# Altium footprint library SAMTEC THD.PcbLib: 161 footprints (part 4 of 12) (continued)
## SAMTEC_MTLW-118-07-L-D-250 [mm] "36 Contacts - Pitch 2.54mm - Dual Row Through Mount Straight Header (Post Lead = 6.35mm, Tail Lead 3.05mm, Insulator 1.52mm)" (continued)
Mechanical 14:
  drawing of 255 lines, arcs and shapes, not listed
  text "1" at -23.837,-1.768 h1
3D body "SAMTEC_MTLW-118-07-L-D-250.stp": height 7.87, standoff -3.05, extent -22.86,-2.514 22.86,2.515

## SAMTEC_MTLW-120-07-L-D-250 [mm] "40 Contacts - Pitch 2.54mm - Dual Row Through Mount Straight Header (Post Lead = 6.35mm, Tail Lead 3.05mm, Insulator 1.52mm)"
height 7.87
pads (40):
  round 1.7 hole 1: 1(-24.13,-1.27) 2(-24.13,1.27) 3(-21.59,-1.27) 4(-21.59,1.27) 5(-19.05,-1.27) 6(-19.05,1.27) 7(-16.51,-1.27) 8(-16.51,1.27) 9(-13.97,-1.27) 10(-13.97,1.27) 11(-11.43,-1.27) 12(-11.43,1.27) 13(-8.89,-1.27) 14(-8.89,1.27) 15(-6.35,-1.27) 16(-6.35,1.27) 17(-3.81,-1.27) 18(-3.81,1.27) 19(-1.27,-1.27) 20(-1.27,1.27) 21(1.27,-1.27) 22(1.27,1.27) 23(3.81,-1.27) 24(3.81,1.27) 25(6.35,-1.27) 26(6.35,1.27) 27(8.89,-1.27) 28(8.89,1.27) 29(11.43,-1.27) 30(11.43,1.27) 31(13.97,-1.27) 32(13.97,1.27) 33(16.51,-1.27) 34(16.51,1.27) 35(19.05,-1.27) 36(19.05,1.27) 37(21.59,-1.27) 38(21.59,1.27) 39(24.13,-1.27) 40(24.13,1.27)
Top Overlay:
  circle w0.3: c-24.095,-3.135 r0.15
  lines w0.2: -25.4,-2.007 -25.4,2.007 -25.146,2.515 -23.114,2.515 -22.86,2.007 -22.606,2.515 -20.574,2.515 -20.32,2.007 -20.066,2.515 -18.034,2.515 -17.78,2.007 -17.526,2.515 -15.494,2.515 -15.24,2.007 -14.986,2.515 -12.954,2.515 -12.7,2.007 -12.446,2.515 -10.414,2.515 -10.16,2.007 -9.906,2.515 -7.874,2.515 -7.62,2.007 -7.366,2.515 -5.334,2.515 -5.08,2.007 -4.826,2.515 -2.794,2.515 -2.54,2.007 -2.286,2.515 -0.254,2.515 0,2.007 0.254,2.515 2.286,2.515 2.54,2.007 2.794,2.515 4.826,2.515 5.08,2.007 5.334,2.515 7.366,2.515 7.62,2.007 7.874,2.515 9.906,2.515 10.16,2.007 10.414,2.515 12.446,2.515 12.7,2.007 12.954,2.515 14.986,2.515 15.24,2.007 15.494,2.515 17.526,2.515 17.78,2.007 18.034,2.515 20.066,2.515 20.32,2.007 20.574,2.515 22.606,2.515 22.86,2.007 23.114,2.515 25.146,2.515 25.4,2.007 25.4,-2.007 25.146,-2.515 23.114,-2.515 22.86,-2.007 22.606,-2.515 20.574,-2.515 20.32,-2.007 20.066,-2.515 18.034,-2.515 17.78,-2.007 17.526,-2.515 15.494,-2.515 15.24,-2.007 14.986,-2.515 12.954,-2.515 12.7,-2.007 12.446,-2.515 10.414,-2.515 10.16,-2.007 9.906,-2.515 7.874,-2.515 7.62,-2.007 7.366,-2.515 5.334,-2.515 5.08,-2.007 4.826,-2.515 2.794,-2.515 2.54,-2.007 2.286,-2.515 0.254,-2.515 0,-2.007 -0.254,-2.515 -2.286,-2.515 -2.54,-2.007 -2.794,-2.515 -4.826,-2.515 -5.08,-2.007 -5.334,-2.515 -7.366,-2.515 -7.62,-2.007 -7.874,-2.515 -9.906,-2.515 -10.16,-2.007 -10.414,-2.515 -12.446,-2.515 -12.7,-2.007 -12.954,-2.515 -14.986,-2.515 -15.24,-2.007 -15.494,-2.515 -17.526,-2.515 -17.78,-2.007 -18.034,-2.515 -20.066,-2.515 -20.32,-2.007 -20.574,-2.515 -22.606,-2.515 -22.86,-2.007 -23.114,-2.515 -25.146,-2.515 -25.4,-2.007
  text "1" at -26.377,-1.768 h1
Mechanical 8:
  drawing of 164 lines, arcs and shapes, not listed
Mechanical 14:
  drawing of 283 lines, arcs and shapes, not listed
  text "1" at -26.377,-1.768 h1
3D body "SAMTEC_MTLW-120-07-L-D-250.stp": height 7.87, standoff -3.05, extent -25.4,-2.514 25.4,2.515

## SAMTEC_MTLW-121-07-L-D-250 [mm] "42 Contacts - Pitch 2.54mm - Dual Row Through Mount Straight Header (Post Lead = 6.35mm, Tail Lead 3.05mm, Insulator 1.52mm)"
height 7.87
pads (42):
  round 1.7 hole 1: 1(-25.4,-1.27) 2(-25.4,1.27) 3(-22.86,-1.27) 4(-22.86,1.27) 5(-20.32,-1.27) 6(-20.32,1.27) 7(-17.78,-1.27) 8(-17.78,1.27) 9(-15.24,-1.27) 10(-15.24,1.27) 11(-12.7,-1.27) 12(-12.7,1.27) 13(-10.16,-1.27) 14(-10.16,1.27) 15(-7.62,-1.27) 16(-7.62,1.27) 17(-5.08,-1.27) 18(-5.08,1.27) 19(-2.54,-1.27) 20(-2.54,1.27) 21(0,-1.27) 22(0,1.27) 23(2.54,-1.27) 24(2.54,1.27) 25(5.08,-1.27) 26(5.08,1.27) 27(7.62,-1.27) 28(7.62,1.27) 29(10.16,-1.27) 30(10.16,1.27) 31(12.7,-1.27) 32(12.7,1.27) 33(15.24,-1.27) 34(15.24,1.27) 35(17.78,-1.27) 36(17.78,1.27) 37(20.32,-1.27) 38(20.32,1.27) 39(22.86,-1.27) 40(22.86,1.27) 41(25.4,-1.27) 42(25.4,1.27)
Top Overlay:
  circle w0.3: c-25.365,-3.135 r0.15
  lines w0.2: -26.67,-2.007 -26.67,2.007 -26.416,2.515 -24.384,2.515 -24.13,2.007 -23.876,2.515 -21.844,2.515 -21.59,2.007 -21.336,2.515 -19.304,2.515 -19.05,2.007 -18.796,2.515 -16.764,2.515 -16.51,2.007 -16.256,2.515 -14.224,2.515 -13.97,2.007 -13.716,2.515 -11.684,2.515 -11.43,2.007 -11.176,2.515 -9.144,2.515 -8.89,2.007 -8.636,2.515 -6.604,2.515 -6.35,2.007 -6.096,2.515 -4.064,2.515 -3.81,2.007 -3.556,2.515 -1.524,2.515 -1.27,2.007 -1.016,2.515 1.016,2.515 1.27,2.007 1.524,2.515 3.556,2.515 3.81,2.007 4.064,2.515 6.096,2.515 6.35,2.007 6.604,2.515 8.636,2.515 8.89,2.007 9.144,2.515 11.176,2.515 11.43,2.007 11.684,2.515 13.716,2.515 13.97,2.007 14.224,2.515 16.256,2.515 16.51,2.007 16.764,2.515 18.796,2.515 19.05,2.007 19.304,2.515 21.336,2.515 21.59,2.007 21.844,2.515 23.876,2.515 24.13,2.007 24.384,2.515 26.416,2.515 26.67,2.007 26.67,-2.007 26.416,-2.515 24.384,-2.515 24.13,-2.007 23.876,-2.515 21.844,-2.515 21.59,-2.007 21.336,-2.515 19.304,-2.515 19.05,-2.007 18.796,-2.515 16.764,-2.515 16.51,-2.007 16.256,-2.515 14.224,-2.515 13.97,-2.007 13.716,-2.515 11.684,-2.515 11.43,-2.007 11.176,-2.515 9.144,-2.515 8.89,-2.007 8.636,-2.515 6.604,-2.515 6.35,-2.007 6.096,-2.515 4.064,-2.515 3.81,-2.007 3.556,-2.515 1.524,-2.515 1.27,-2.007 1.016,-2.515 -1.016,-2.515 -1.27,-2.007 -1.524,-2.515 -3.556,-2.515 -3.81,-2.007 -4.064,-2.515 -6.096,-2.515 -6.35,-2.007 -6.604,-2.515 -8.636,-2.515 -8.89,-2.007 -9.144,-2.515 -11.176,-2.515 -11.43,-2.007 -11.684,-2.515 -13.716,-2.515 -13.97,-2.007 -14.224,-2.515 -16.256,-2.515 -16.51,-2.007 -16.764,-2.515 -18.796,-2.515 -19.05,-2.007 -19.304,-2.515 -21.336,-2.515 -21.59,-2.007 -21.844,-2.515 -23.876,-2.515 -24.13,-2.007 -24.384,-2.515 -26.416,-2.515 -26.67,-2.007
  text "1" at -27.647,-1.768 h1
Mechanical 8:
  drawing of 172 lines, arcs and shapes, not listed
Mechanical 14:
  drawing of 297 lines, arcs and shapes, not listed
  text "1" at -27.647,-1.768 h1
3D body "SAMTEC_MTLW-121-07-L-D-250.stp": height 7.87, standoff -3.05, extent -26.67,-2.514 26.67,2.515

## SAMTEC_MTLW-122-07-L-D-250 [mm] "44 Contacts - Pitch 2.54mm - Dual Row Through Mount Straight Header (Post Lead = 6.35mm, Tail Lead 3.05mm, Insulator 1.52mm)"
height 7.87
pads (44):
  round 1.7 hole 1: 1(-26.67,-1.27) 2(-26.67,1.27) 3(-24.13,-1.27) 4(-24.13,1.27) 5(-21.59,-1.27) 6(-21.59,1.27) 7(-19.05,-1.27) 8(-19.05,1.27) 9(-16.51,-1.27) 10(-16.51,1.27) 11(-13.97,-1.27) 12(-13.97,1.27) 13(-11.43,-1.27) 14(-11.43,1.27) 15(-8.89,-1.27) 16(-8.89,1.27) 17(-6.35,-1.27) 18(-6.35,1.27) 19(-3.81,-1.27) 20(-3.81,1.27) 21(-1.27,-1.27) 22(-1.27,1.27) 23(1.27,-1.27) 24(1.27,1.27) 25(3.81,-1.27) 26(3.81,1.27) 27(6.35,-1.27) 28(6.35,1.27) 29(8.89,-1.27) 30(8.89,1.27) 31(11.43,-1.27) 32(11.43,1.27) 33(13.97,-1.27) 34(13.97,1.27) 35(16.51,-1.27) 36(16.51,1.27) 37(19.05,-1.27) 38(19.05,1.27) 39(21.59,-1.27) 40(21.59,1.27) 41(24.13,-1.27) 42(24.13,1.27) 43(26.67,-1.27) 44(26.67,1.27)
Top Overlay:
  circle w0.3: c-26.635,-3.135 r0.15
  lines w0.2: -27.94,-2.007 -27.94,2.007 -27.686,2.515 -25.654,2.515 -25.4,2.007 -25.146,2.515 -23.114,2.515 -22.86,2.007 -22.606,2.515 -20.574,2.515 -20.32,2.007 -20.066,2.515 -18.034,2.515 -17.78,2.007 -17.526,2.515 -15.494,2.515 -15.24,2.007 -14.986,2.515 -12.954,2.515 -12.7,2.007 -12.446,2.515 -10.414,2.515 -10.16,2.007 -9.906,2.515 -7.874,2.515 -7.62,2.007 -7.366,2.515 -5.334,2.515 -5.08,2.007 -4.826,2.515 -2.794,2.515 -2.54,2.007 -2.286,2.515 -0.254,2.515 0,2.007 0.254,2.515 2.286,2.515 2.54,2.007 2.794,2.515 4.826,2.515 5.08,2.007 5.334,2.515 7.366,2.515 7.62,2.007 7.874,2.515 9.906,2.515 10.16,2.007 10.414,2.515 12.446,2.515 12.7,2.007 12.954,2.515 14.986,2.515 15.24,2.007 15.494,2.515 17.526,2.515 17.78,2.007 18.034,2.515 20.066,2.515 20.32,2.007 20.574,2.515 22.606,2.515 22.86,2.007 23.114,2.515 25.146,2.515 25.4,2.007 25.654,2.515 27.686,2.515 27.94,2.007 27.94,-2.007 27.686,-2.515 25.654,-2.515 25.4,-2.007 25.146,-2.515 23.114,-2.515 22.86,-2.007 22.606,-2.515 20.574,-2.515 20.32,-2.007 20.066,-2.515 18.034,-2.515 17.78,-2.007 17.526,-2.515 15.494,-2.515 15.24,-2.007 14.986,-2.515 12.954,-2.515 12.7,-2.007 12.446,-2.515 10.414,-2.515 10.16,-2.007 9.906,-2.515 7.874,-2.515 7.62,-2.007 7.366,-2.515 5.334,-2.515 5.08,-2.007 4.826,-2.515 2.794,-2.515 2.54,-2.007 2.286,-2.515 0.254,-2.515 0,-2.007 -0.254,-2.515 -2.286,-2.515 -2.54,-2.007 -2.794,-2.515 -4.826,-2.515 -5.08,-2.007 -5.334,-2.515 -7.366,-2.515 -7.62,-2.007 -7.874,-2.515 -9.906,-2.515 -10.16,-2.007 -10.414,-2.515 -12.446,-2.515 -12.7,-2.007 -12.954,-2.515 -14.986,-2.515 -15.24,-2.007 -15.494,-2.515 -17.526,-2.515 -17.78,-2.007 -18.034,-2.515 -20.066,-2.515 -20.32,-2.007 -20.574,-2.515 -22.606,-2.515 -22.86,-2.007 -23.114,-2.515 -25.146,-2.515 -25.4,-2.007 -25.654,-2.515 -27.686,-2.515 -27.94,-2.007
  text "1" at -28.917,-1.768 h1
Mechanical 8:
  drawing of 180 lines, arcs and shapes, not listed
Mechanical 14:
  drawing of 311 lines, arcs and shapes, not listed
  text "1" at -28.917,-1.768 h1
3D body "SAMTEC_MTLW-122-07-L-D-250.stp": height 7.87, standoff -3.05, extent -27.94,-2.514 27.94,2.515

## SAMTEC_MTLW-125-07-L-D-250 [mm] "50 Contacts - Pitch 2.54mm - Dual Row Through Mount Straight Header (Post Lead = 6.35mm, Tail Lead 3.05mm, Insulator 1.52mm)"
height 7.87
pads (50):
  round 1.7 hole 1: 1(-30.48,-1.27) 2(-30.48,1.27) 3(-27.94,-1.27) 4(-27.94,1.27) 5(-25.4,-1.27) 6(-25.4,1.27) 7(-22.86,-1.27) 8(-22.86,1.27) 9(-20.32,-1.27) 10(-20.32,1.27) 11(-17.78,-1.27) 12(-17.78,1.27) 13(-15.24,-1.27) 14(-15.24,1.27) 15(-12.7,-1.27) 16(-12.7,1.27) 17(-10.16,-1.27) 18(-10.16,1.27) 19(-7.62,-1.27) 20(-7.62,1.27) 21(-5.08,-1.27) 22(-5.08,1.27) 23(-2.54,-1.27) 24(-2.54,1.27) 25(0,-1.27) 26(0,1.27) 27(2.54,-1.27) 28(2.54,1.27) 29(5.08,-1.27) 30(5.08,1.27) 31(7.62,-1.27) 32(7.62,1.27) 33(10.16,-1.27) 34(10.16,1.27) 35(12.7,-1.27) 36(12.7,1.27) 37(15.24,-1.27) 38(15.24,1.27) 39(17.78,-1.27) 40(17.78,1.27) 41(20.32,-1.27) 42(20.32,1.27) 43(22.86,-1.27) 44(22.86,1.27) 45(25.4,-1.27) 46(25.4,1.27) 47(27.94,-1.27) 48(27.94,1.27) 49(30.48,-1.27) 50(30.48,1.27)
Top Overlay:
  drawing of 153 lines, arcs and shapes, not listed
  text "1" at -32.727,-1.768 h1
Mechanical 8:
  drawing of 204 lines, arcs and shapes, not listed
Mechanical 14:
  drawing of 353 lines, arcs and shapes, not listed
  text "1" at -32.727,-1.768 h1
3D body "SAMTEC_MTLW-125-07-L-D-250.stp": height 7.87, standoff -3.05, extent -31.75,-2.514 31.75,2.515

## SAMTEC_MTLW-132-07-L-D-250 [mm] "64 Contacts - Pitch 2.54mm - Dual Row Through Mount Straight Header (Post Lead = 6.35mm, Tail Lead 3.05mm, Insulator 1.52mm)"
height 7.87
pads (64):
  round 1.7 hole 1: 1(-39.37,-1.27) 2(-39.37,1.27) 3(-36.83,-1.27) 4(-36.83,1.27) 5(-34.29,-1.27) 6(-34.29,1.27) 7(-31.75,-1.27) 8(-31.75,1.27) 9(-29.21,-1.27) 10(-29.21,1.27) 11(-26.67,-1.27) 12(-26.67,1.27) 13(-24.13,-1.27) 14(-24.13,1.27) 15(-21.59,-1.27) 16(-21.59,1.27) 17(-19.05,-1.27) 18(-19.05,1.27) 19(-16.51,-1.27) 20(-16.51,1.27) 21(-13.97,-1.27) 22(-13.97,1.27) 23(-11.43,-1.27) 24(-11.43,1.27) 25(-8.89,-1.27) 26(-8.89,1.27) 27(-6.35,-1.27) 28(-6.35,1.27) 29(-3.81,-1.27) 30(-3.81,1.27) 31(-1.27,-1.27) 32(-1.27,1.27) 33(1.27,-1.27) 34(1.27,1.27) 35(3.81,-1.27) 36(3.81,1.27) 37(6.35,-1.27) 38(6.35,1.27) 39(8.89,-1.27) 40(8.89,1.27) 41(11.43,-1.27) 42(11.43,1.27) 43(13.97,-1.27) 44(13.97,1.27) 45(16.51,-1.27) 46(16.51,1.27) 47(19.05,-1.27) 48(19.05,1.27) 49(21.59,-1.27) 50(21.59,1.27) 51(24.13,-1.27) 52(24.13,1.27) 53(26.67,-1.27) 54(26.67,1.27) 55(29.21,-1.27) 56(29.21,1.27) 57(31.75,-1.27) 58(31.75,1.27) 59(34.29,-1.27) 60(34.29,1.27) 61(36.83,-1.27) 62(36.83,1.27) 63(39.37,-1.27) 64(39.37,1.27)
Top Overlay:
  drawing of 196 lines, arcs and shapes, not listed
  text "1" at -41.617,-1.768 h1
Mechanical 8:
  drawing of 260 lines, arcs and shapes, not listed
Mechanical 14:
  drawing of 451 lines, arcs and shapes, not listed
3D body "SAMTEC_MTLW-132-07-L-D-250.stp": height 7.87, standoff -3.05, extent -40.64,-2.514 40.64,2.515

## SAMTEC_PCIE-098-02-F-D-RA [mm] "PCI Express Right Angle Socket"
height 9.45
pads (100):
  round 1.4 hole 0.7: A1(25,6.5) A2(24,4.5) A3(23,6.5) A4(22,4.5) A5(21,6.5) A6(20,4.5) A7(19,6.5) A8(18,4.5) A9(17,6.5) A10(16,4.5) A11(15,6.5) A12(12,4.5) A13(11,6.5) A14(10,4.5) A15(9,6.5) A16(8,4.5) A17(7,6.5) A18(6,4.5) A19(5,6.5) A20(4,4.5) A21(3,6.5) A22(2,4.5) A23(1,6.5) A24(0,4.5) A25(-1,6.5) A26(-2,4.5) A27(-3,6.5) A28(-4,4.5) A29(-5,6.5) A30(-6,4.5) A31(-7,6.5) A32(-8,4.5) A33(-9,6.5) A34(-10,4.5) A35(-11,6.5) A36(-12,4.5) A37(-13,6.5) A38(-14,4.5) A39(-15,6.5) A40(-16,4.5) A41(-17,6.5) A42(-18,4.5) A43(-19,6.5) A44(-20,4.5) A45(-21,6.5) A46(-22,4.5) A47(-23,6.5) A48(-24,4.5) A49(-25,6.5) B1(25,9) B2(24,11) B3(23,9) B4(22,11) B5(21,9) B6(20,11) B7(19,9) B8(18,11) B9(17,9) B10(16,11) B11(15,9) B12(12,11) B13(11,9) B14(10,11) B15(9,9) B16(8,11) B17(7,9) B18(6,11) B19(5,9) B20(4,11) B21(3,9) B22(2,11) B23(1,9) B24(0,11) B25(-1,9) B26(-2,11) B27(-3,9) B28(-4,11) B29(-5,9) B30(-6,11) B31(-7,9) B32(-8,11) B33(-9,9) B34(-10,11) B35(-11,9) B36(-12,11) B37(-13,9) B38(-14,11) B39(-15,9) B40(-16,11) B41(-17,9) B42(-18,11) B43(-19,9) B44(-20,11) B45(-21,9) B46(-22,11) B47(-23,9) B48(-24,11) B49(-25,9)
  round 0.5 hole 2.35 unplated mask+0.925: MECH1(-26.8,0) MECH2(13.35,0)
Top Overlay:
  lines w0.2: -28,-0.858 -28,-7.55 28,-7.55 28,12.05 -28,12.05 -28,0.858 ; -28,3.5 28,3.5 ; -28,9.75 -26.5,9.75 ; 26.5,9.75 28,9.75
  text "B2" at 28.7,10.4 h1.2
  text "B1" at 28.7,8.4 h1.2
  text "A1" at 28.7,5.9 h1.2
  text "A2" at 28.7,3.9 h1.2
Mechanical 8:
  drawing of 411 lines, arcs and shapes, not listed
Mechanical 14:
  drawing of 769 lines, arcs and shapes, not listed
  text "A48" at -27.6,4.025 h1
  text "B2" at 25.33,10.46 h1
  text "B1" at 26.171,8.46 h1
  text "A1" at 26.171,5.96 h1
  text "A2" at 25.171,3.96 h1
  text "B49" at -27.7,10.575 h1
3D body "SAMTEC_PCIE-098-02-F-D-RA.stp": height 9.45, standoff -4.4, extent -28,-7.55 28,11.3

## SAMTEC_PCIE-164-02-F-D-RA [mm] "164 Positions PCI Express Right Angle Socket"
height 9.45
pads (166):
  round 1.4 hole 0.7: A1(41.517,6.5) A2(40.517,4.5) A3(39.517,6.5) A4(38.517,4.5) A5(37.517,6.5) A6(36.517,4.5) A7(35.517,6.5) A8(34.517,4.5) A9(33.517,6.5) A10(32.517,4.5) A11(31.517,6.5) A12(28.517,4.5) A13(27.517,6.5) A14(26.517,4.5) A15(25.517,6.5) A16(24.517,4.5) A17(23.517,6.5) A18(22.517,4.5) A19(21.517,6.5) A20(20.517,4.5) A21(19.517,6.5) A22(18.517,4.5) A23(17.517,6.5) A24(16.517,4.5) A25(15.517,6.5) A26(14.517,4.5) A27(13.517,6.5) A28(12.517,4.5) A29(11.517,6.5) A30(10.517,4.5) A31(9.517,6.5) A32(8.517,4.5) A33(7.517,6.5) A34(6.517,4.5) A35(5.517,6.5) A36(4.517,4.5) A37(3.517,6.5) A38(2.517,4.5) A39(1.517,6.5) A40(0.517,4.5) A41(-0.483,6.5) A42(-1.483,4.5) A43(-2.483,6.5) A44(-3.483,4.5) A45(-4.483,6.5) A46(-5.483,4.5) A47(-6.483,6.5) A48(-7.483,4.5) A49(-8.483,6.5) A50(-9.483,4.5) A51(-10.483,6.5) A52(-11.483,4.5) A53(-12.483,6.5) A54(-13.483,4.5) A55(-14.483,6.5) A56(-15.483,4.5) A57(-16.483,6.5) A58(-17.483,4.5) A59(-18.483,6.5) A60(-19.483,4.5) A61(-20.483,6.5) A62(-21.483,4.5) A63(-22.483,6.5) A64(-23.483,4.5) A65(-24.483,6.5) A66(-25.483,4.5) A67(-26.483,6.5) A68(-27.483,4.5) A69(-28.483,6.5) A70(-29.483,4.5) A71(-30.483,6.5) A72(-31.483,4.5) A73(-32.483,6.5) A74(-33.483,4.5) A75(-34.483,6.5) A76(-35.483,4.5) A77(-36.483,6.5) A78(-37.483,4.5) A79(-38.483,6.5) A80(-39.483,4.5) A81(-40.483,6.5) A82(-41.483,4.5) B1(41.517,9) B2(40.517,11) B3(39.517,9) B4(38.517,11) B5(37.517,9) B6(36.517,11) B7(35.517,9) B8(34.517,11) B9(33.517,9) B10(32.517,11) B11(31.517,9) B12(28.517,11) B13(27.517,9) B14(26.517,11) B15(25.517,9) B16(24.517,11) B17(23.517,9) B18(22.517,11) B19(21.517,9) B20(20.517,11) B21(19.517,9) B22(18.517,11) B23(17.517,9) B24(16.517,11) B25(15.517,9) B26(14.517,11) B27(13.517,9) B28(12.517,11) B29(11.517,9) B30(10.517,11) B31(9.517,9) B32(8.517,11) B33(7.517,9) B34(6.517,11) B35(5.517,9) B36(4.517,11) B37(3.517,9) B38(2.517,11) B39(1.517,9) B40(0.517,11) B41(-0.483,9) B42(-1.483,11) B43(-2.483,9) B44(-3.483,11) B45(-4.483,9) B46(-5.483,11) B47(-6.483,9) B48(-7.483,11) B49(-8.483,9) B50(-9.483,11) B51(-10.483,9) B52(-11.483,11) B53(-12.483,9) B54(-13.483,11) B55(-14.483,9) B56(-15.483,11) B57(-16.483,9) B58(-17.483,11) B59(-18.483,9) B60(-19.483,11) B61(-20.483,9) B62(-21.483,11) B63(-22.483,9) B64(-23.483,11) B65(-24.483,9) B66(-25.483,11) B67(-26.483,9) B68(-27.483,11) B69(-28.483,9) B70(-29.483,11) B71(-30.483,9) B72(-31.483,11) B73(-32.483,9) B74(-33.483,11) B75(-34.483,9) B76(-35.483,11) B77(-36.483,9) B78(-37.483,11) B79(-38.483,9) B80(-39.483,11) B81(-40.483,9) B82(-41.483,11)
  round 0.5 hole 2.35 unplated mask+0.925: MECH1(-43.283,0) MECH2(29.867,0)
Top Overlay:
  lines w0.2: -44.5,-0.918 -44.5,-7.55 44.5,-7.55 44.5,9.749 43.2,9.749 ; -44.5,0.919 -44.5,9.749 -43.2,9.749 ; -44.5,3.499 -41.8,3.499 ; -43.2,6.5 -41.66,6.5 ; -43.2,9.85 -41.66,9.85 ; -43.2,10.3 -42.265,10.3 ; -42.689,3.499 -42.689,6 ; -42.489,11.3 -43.2,11.3 -43.2,6 -41.66,6 ; 28.695,6 30.594,6 ; 28.695,6.5 30.467,6.5 ; 28.695,9.85 30.901,9.85 ; 28.834,3.499 32.2,3.499 ; 29.25,3.499 29.25,3.748 ; 29.25,5.252 29.25,5.8 30.735,5.8 ; 29.3,10.3 31.735,10.3 ; 29.524,11.3 31.511,11.3 ; 30.75,3.499 30.75,5.783 ; 40.834,3.499 44.5,3.499 ; 41.3,10.3 43.2,10.3 ; 41.524,11.3 43.2,11.3 43.2,6 42.441,6 ; 42.134,9.85 43.2,9.85 ; 42.567,6.5 43.2,6.5 ; 42.711,3.499 42.711,6
  text "A2" at 45.217,3.9 h1.2
  text "A1" at 45.217,5.9 h1.2
  text "B1" at 45.217,8.4 h1.2
  text "B2" at 45.217,10.4 h1.2
Mechanical 8:
  drawing of 674 lines, arcs and shapes, not listed
Mechanical 14:
  drawing of 649 lines, arcs and shapes, not listed
  text "B82" at -46.425,10.225 h1
  text "B2" at 45.217,10.4 h1.2
  text "B1" at 45.217,8.4 h1.2
  text "A1" at 45.217,5.9 h1.2
  text "A2" at 45.217,3.9 h1.2
3D body "SAMTEC_PCIE-164-02-F-D-RA.stp": height 9.45, standoff -4.41, extent -44.5,-7.55 44.5,11.3

## SAMTEC_PHT-112-01-L-D-024 [mm] "23 Contacts +1 Polarized Position(24) , Pitch 2.54mm - Dual Row, Press-Fit Straigh Header"
height 11.48
pads (23):
  round 1.7 hole 1: 1(-13.97,-1.27) 2(-13.97,1.27) 3(-11.43,-1.27) 4(-11.43,1.27) 5(-8.89,-1.27) 6(-8.89,1.27) 7(-6.35,-1.27) 8(-6.35,1.27) 9(-3.81,-1.27) 10(-3.81,1.27) 11(-1.27,-1.27) 12(-1.27,1.27) 13(1.27,-1.27) 14(1.27,1.27) 15(3.81,-1.27) 16(3.81,1.27) 17(6.35,-1.27) 18(6.35,1.27) 19(8.89,-1.27) 20(8.89,1.27) 21(11.43,-1.27) 22(11.43,1.27) 23(13.97,-1.27)
Top Overlay:
  circle w0.3: c-13.935,-3.135 r0.15
  lines w0.2: -12.827,-2.032 -12.573,-2.032 ; -10.287,-2.032 -10.033,-2.032 ; -10.287,2.032 -10.033,2.032 ; 13.322,0.622 14.618,0.622 ; 13.322,0.622 13.322,1.918 ; 13.322,0.622 13.653,0.953 ; 13.322,1.918 14.618,1.918 ; 13.322,1.918 13.653,1.587 ; 13.653,0.953 14.288,0.953 ; 13.653,0.953 13.653,1.587 ; 13.653,1.587 14.288,1.587 ; 14.288,0.953 14.288,1.587 ; 14.288,0.953 14.618,0.622 ; 14.288,1.587 14.618,1.918 ; 14.618,0.622 14.618,1.918 ; 15.24,-2.515 15.24,2.515 ; 15.24,-2.515 12.954,-2.515 12.954,-2.032 12.446,-2.032 12.446,-2.515 10.414,-2.515 10.414,-2.032 9.906,-2.032 9.906,-2.515 7.874,-2.515 7.874,-2.032 7.366,-2.032 7.366,-2.515 5.334,-2.515 5.334,-2.032 4.826,-2.032 4.826,-2.515 2.794,-2.515 2.794,-2.032 2.286,-2.032 2.286,-2.515 0.254,-2.515 0.254,-2.032 -0.254,-2.032 -0.254,-2.515 -2.286,-2.515 -2.286,-2.032 -2.794,-2.032 -2.794,-2.515 -4.826,-2.515 -4.826,-2.032 -5.334,-2.032 -5.334,-2.515 -7.366,-2.515 -7.366,-2.032 -7.874,-2.032 -7.874,-2.515 -9.906,-2.515 -9.906,-2.032 -10.414,-2.032 -10.414,-2.515 -12.446,-2.515 -12.446,-2.032 -12.954,-2.032 -12.954,-2.515 -15.24,-2.515 -15.24,2.515 -12.954,2.515 -12.954,2.032 -12.446,2.032 -12.446,2.515 -10.414,2.515 -10.414,2.032 -9.906,2.032 -9.906,2.515 -7.874,2.515 -7.874,2.032 -7.366,2.032 -7.366,2.515 -5.334,2.515 -5.334,2.032 -4.826,2.032 -4.826,2.515 -2.794,2.515 -2.794,2.032 -2.286,2.032 -2.286,2.515 -0.254,2.515 -0.254,2.032 0.254,2.032 0.254,2.515 2.286,2.515 2.286,2.032 2.794,2.032 2.794,2.515 4.826,2.515 4.826,2.032 5.334,2.032 5.334,2.515 7.366,2.515 7.366,2.032 7.874,2.032 7.874,2.515 9.906,2.515 9.906,2.032 10.414,2.032 10.414,2.515 12.446,2.515 12.446,2.032 12.954,2.032 12.954,2.515 15.24,2.515 ; 15.24,-2.515 15.24,2.515
  text "1" at -16.217,-1.768 h1
Mechanical 8:
  lines w0.1: -14.47,-1.27 -13.97,-1.27 ; -14.47,1.27 -13.97,1.27 ; -13.97,-1.77 -13.97,-1.27 ; -13.97,-0.77 -13.97,-1.27 ; -13.97,0.77 -13.97,1.27 ; -13.97,1.77 -13.97,1.27 ; -13.47,-1.27 -13.97,-1.27 ; -13.47,1.27 -13.97,1.27 ; -11.93,-1.27 -11.43,-1.27 ; -11.93,1.27 -11.43,1.27 ; -11.43,-1.77 -11.43,-1.27 ; -11.43,-0.77 -11.43,-1.27 ; -11.43,0.77 -11.43,1.27 ; -11.43,1.77 -11.43,1.27 ; -10.93,-1.27 -11.43,-1.27 ; -10.93,1.27 -11.43,1.27 ; -9.39,-1.27 -8.89,-1.27 ; -9.39,1.27 -8.89,1.27 ; -8.89,-1.77 -8.89,-1.27 ; -8.89,-0.77 -8.89,-1.27 ; -8.89,0.77 -8.89,1.27 ; -8.89,1.77 -8.89,1.27 ; -8.39,-1.27 -8.89,-1.27 ; -8.39,1.27 -8.89,1.27 ; -6.85,-1.27 -6.35,-1.27 ; -6.85,1.27 -6.35,1.27 ; -6.35,-1.77 -6.35,-1.27 ; -6.35,-0.77 -6.35,-1.27 ; -6.35,0.77 -6.35,1.27 ; -6.35,1.77 -6.35,1.27 ; -5.85,-1.27 -6.35,-1.27 ; -5.85,1.27 -6.35,1.27 ; -4.31,-1.27 -3.81,-1.27 ; -4.31,1.27 -3.81,1.27 ; -3.81,-1.77 -3.81,-1.27 ; -3.81,-0.77 -3.81,-1.27 ; -3.81,0.77 -3.81,1.27 ; -3.81,1.77 -3.81,1.27 ; -3.31,-1.27 -3.81,-1.27 ; -3.31,1.27 -3.81,1.27 ; -1.77,-1.27 -1.27,-1.27 ; -1.77,1.27 -1.27,1.27 ; -1.27,-1.77 -1.27,-1.27 ; -1.27,-0.77 -1.27,-1.27 ; -1.27,0.77 -1.27,1.27 ; -1.27,1.77 -1.27,1.27 ; -0.77,-1.27 -1.27,-1.27 ; -0.77,1.27 -1.27,1.27 ; -0.5,0 0,0 ; 0,-0.5 0,0 ; 0,0.5 0,0 ; 0.5,0 0,0 ; 0.77,-1.27 1.27,-1.27 ; 0.77,1.27 1.27,1.27 ; 1.27,-1.77 1.27,-1.27 ; 1.27,-0.77 1.27,-1.27 ; 1.27,0.77 1.27,1.27 ; 1.27,1.77 1.27,1.27 ; 1.77,-1.27 1.27,-1.27 ; 1.77,1.27 1.27,1.27 ; 3.31,-1.27 3.81,-1.27 ; 3.31,1.27 3.81,1.27 ; 3.81,-1.77 3.81,-1.27 ; 3.81,-0.77 3.81,-1.27 ; 3.81,0.77 3.81,1.27 ; 3.81,1.77 3.81,1.27 ; 4.31,-1.27 3.81,-1.27 ; 4.31,1.27 3.81,1.27 ; 5.85,-1.27 6.35,-1.27 ; 5.85,1.27 6.35,1.27 ; 6.35,-1.77 6.35,-1.27 ; 6.35,-0.77 6.35,-1.27 ; 6.35,0.77 6.35,1.27 ; 6.35,1.77 6.35,1.27 ; 6.85,-1.27 6.35,-1.27 ; 6.85,1.27 6.35,1.27 ; 8.39,-1.27 8.89,-1.27 ; 8.39,1.27 8.89,1.27 ; 8.89,-1.77 8.89,-1.27 ; 8.89,-0.77 8.89,-1.27 ; 8.89,0.77 8.89,1.27 ; 8.89,1.77 8.89,1.27 ; 9.39,-1.27 8.89,-1.27 ; 9.39,1.27 8.89,1.27 ; 10.93,-1.27 11.43,-1.27 ; 10.93,1.27 11.43,1.27 ; 11.43,-1.77 11.43,-1.27 ; 11.43,-0.77 11.43,-1.27 ; 11.43,0.77 11.43,1.27 ; 11.43,1.77 11.43,1.27 ; 11.93,-1.27 11.43,-1.27 ; 11.93,1.27 11.43,1.27 ; 13.47,-1.27 13.97,-1.27 ; 13.47,1.27 13.97,1.27 ; 13.97,-1.77 13.97,-1.27 ; 13.97,-0.77 13.97,-1.27 ; 13.97,0.77 13.97,1.27 ; 13.97,1.77 13.97,1.27 ; 14.47,-1.27 13.97,-1.27 ; 14.47,1.27 13.97,1.27
Mechanical 14:
  drawing of 380 lines, arcs and shapes, not listed
  text "1" at -16.217,-1.768 h1
Mechanical 15:
  lines w0.05: -20.24,-7.54 20.24,-7.54 20.24,7.54 -20.24,7.54 -20.24,-7.54
  text "Do Not Put Any Component With a Height More Than" at -19.6,3.075 h1
  text "4mm Tickness on a Zone of 5mm Around The Connector." at -20.24,-3.775 h1
Drill Drawing:
  lines w0.1: -15.24,-4.81 -15.24,4.6 15.24,4.6 15.24,-4.81 -15.24,-4.81
  text "Diam. 1mm +0.09 -0.06" at -9.45,-4.15 h1
  text "PRESS-FIT TECHNOLOGY" at -9.3,3.15 h1
3D body "SAMTEC_PHT-112-01-L-D-024.stp": height 8.38, standoff -3.1, extent -15.24,-2.515 15.24,2.515

## SAMTEC_SFM-106-01-L-D-A [mm] "12 Contacts - Pitch 1.27mm - Dual Row Straight Through-Hole Socket"
height 4.57
pads (14):
  rrect50% 1.05x1.05 hole 0.65: 1(-3.175,0.635) 2(-3.175,-0.635) 3(-1.905,0.635) 4(-1.905,-0.635) 5(-0.635,0.635) 6(-0.635,-0.635) 7(0.635,0.635) 8(0.635,-0.635) 9(1.905,0.635) 10(1.905,-0.635) 11(3.175,0.635) 12(3.175,-0.635)
  round 0.5 hole 1.4 unplated mask+0.45: MECH1(-4.763,0) MECH2(4.763,0)
Top Overlay:
  circle w0.3: c-3.235,2.125 r0.15
  lines w0.2: -4,-0.648 -4,-1.524 4.001,-1.524 4.001,-0.648 ; -4,0.648 -4,1.524 4.001,1.524 4.001,0.648 ; 1.969,-1.524 1.969,-2.159 3.493,-2.159 3.493,-1.524
  text "1" at -4.947,1.337 h1
Mechanical 8:
  lines w0.1: -5.263,0 -4.763,0 ; -4.763,-0.5 -4.763,0 ; -4.763,0.5 -4.763,0 ; -4.263,0 -4.763,0 ; -3.675,-0.635 -3.175,-0.635 ; -3.675,0.635 -3.175,0.635 ; -3.175,-1.135 -3.175,-0.635 ; -3.175,-0.135 -3.175,-0.635 ; -3.175,0.135 -3.175,0.635 ; -3.175,1.135 -3.175,0.635 ; -2.675,-0.635 -3.175,-0.635 ; -2.675,0.635 -3.175,0.635 ; -2.405,-0.635 -1.905,-0.635 ; -2.405,0.635 -1.905,0.635 ; -1.905,-1.135 -1.905,-0.635 ; -1.905,-0.135 -1.905,-0.635 ; -1.905,0.135 -1.905,0.635 ; -1.905,1.135 -1.905,0.635 ; -1.405,-0.635 -1.905,-0.635 ; -1.405,0.635 -1.905,0.635 ; -1.135,-0.635 -0.635,-0.635 ; -1.135,0.635 -0.635,0.635 ; -0.635,-1.135 -0.635,-0.635 ; -0.635,-0.135 -0.635,-0.635 ; -0.635,0.135 -0.635,0.635 ; -0.635,1.135 -0.635,0.635 ; -0.354,-0.354 0,0 ; -0.354,0.354 0,0 ; -0.135,-0.635 -0.635,-0.635 ; -0.135,0.635 -0.635,0.635 ; 0.135,-0.635 0.635,-0.635 ; 0.135,0.635 0.635,0.635 ; 0.354,-0.354 0,0 ; 0.354,0.354 0,0 ; 0.635,-1.135 0.635,-0.635 ; 0.635,-0.135 0.635,-0.635 ; 0.635,0.135 0.635,0.635 ; 0.635,1.135 0.635,0.635 ; 1.135,-0.635 0.635,-0.635 ; 1.135,0.635 0.635,0.635 ; 1.405,-0.635 1.905,-0.635 ; 1.405,0.635 1.905,0.635 ; 1.905,-1.135 1.905,-0.635 ; 1.905,-0.135 1.905,-0.635 ; 1.905,0.135 1.905,0.635 ; 1.905,1.135 1.905,0.635 ; 2.405,-0.635 1.905,-0.635 ; 2.405,0.635 1.905,0.635 ; 2.675,-0.635 3.175,-0.635 ; 2.675,0.635 3.175,0.635 ; 3.175,-1.135 3.175,-0.635 ; 3.175,-0.135 3.175,-0.635 ; 3.175,0.135 3.175,0.635 ; 3.175,1.135 3.175,0.635 ; 3.675,-0.635 3.175,-0.635 ; 3.675,0.635 3.175,0.635 ; 4.263,0 4.763,0 ; 4.763,-0.5 4.763,0 ; 4.763,0.5 4.763,0 ; 5.263,0 4.763,0
Mechanical 14:
  drawing of 162 lines, arcs and shapes, not listed
  text "1" at -4.947,1.337 h1
3D body: height 4.57, standoff -1.6, extent -5.397,-2.159 5.398,1.524